# Altium footprint library Connectors.PcbLib: 245 footprints (part 4 of 16)
Each footprint in its own frame and in the unit in brackets; x right, y up, seen from the top. Pads: shape width x height; smd on the part's side, far side on the other; paste and mask are expansions set on the pad; w line width, h text height; cw(c..) or ccw(c..) is an arc to the next point about the centre after c.
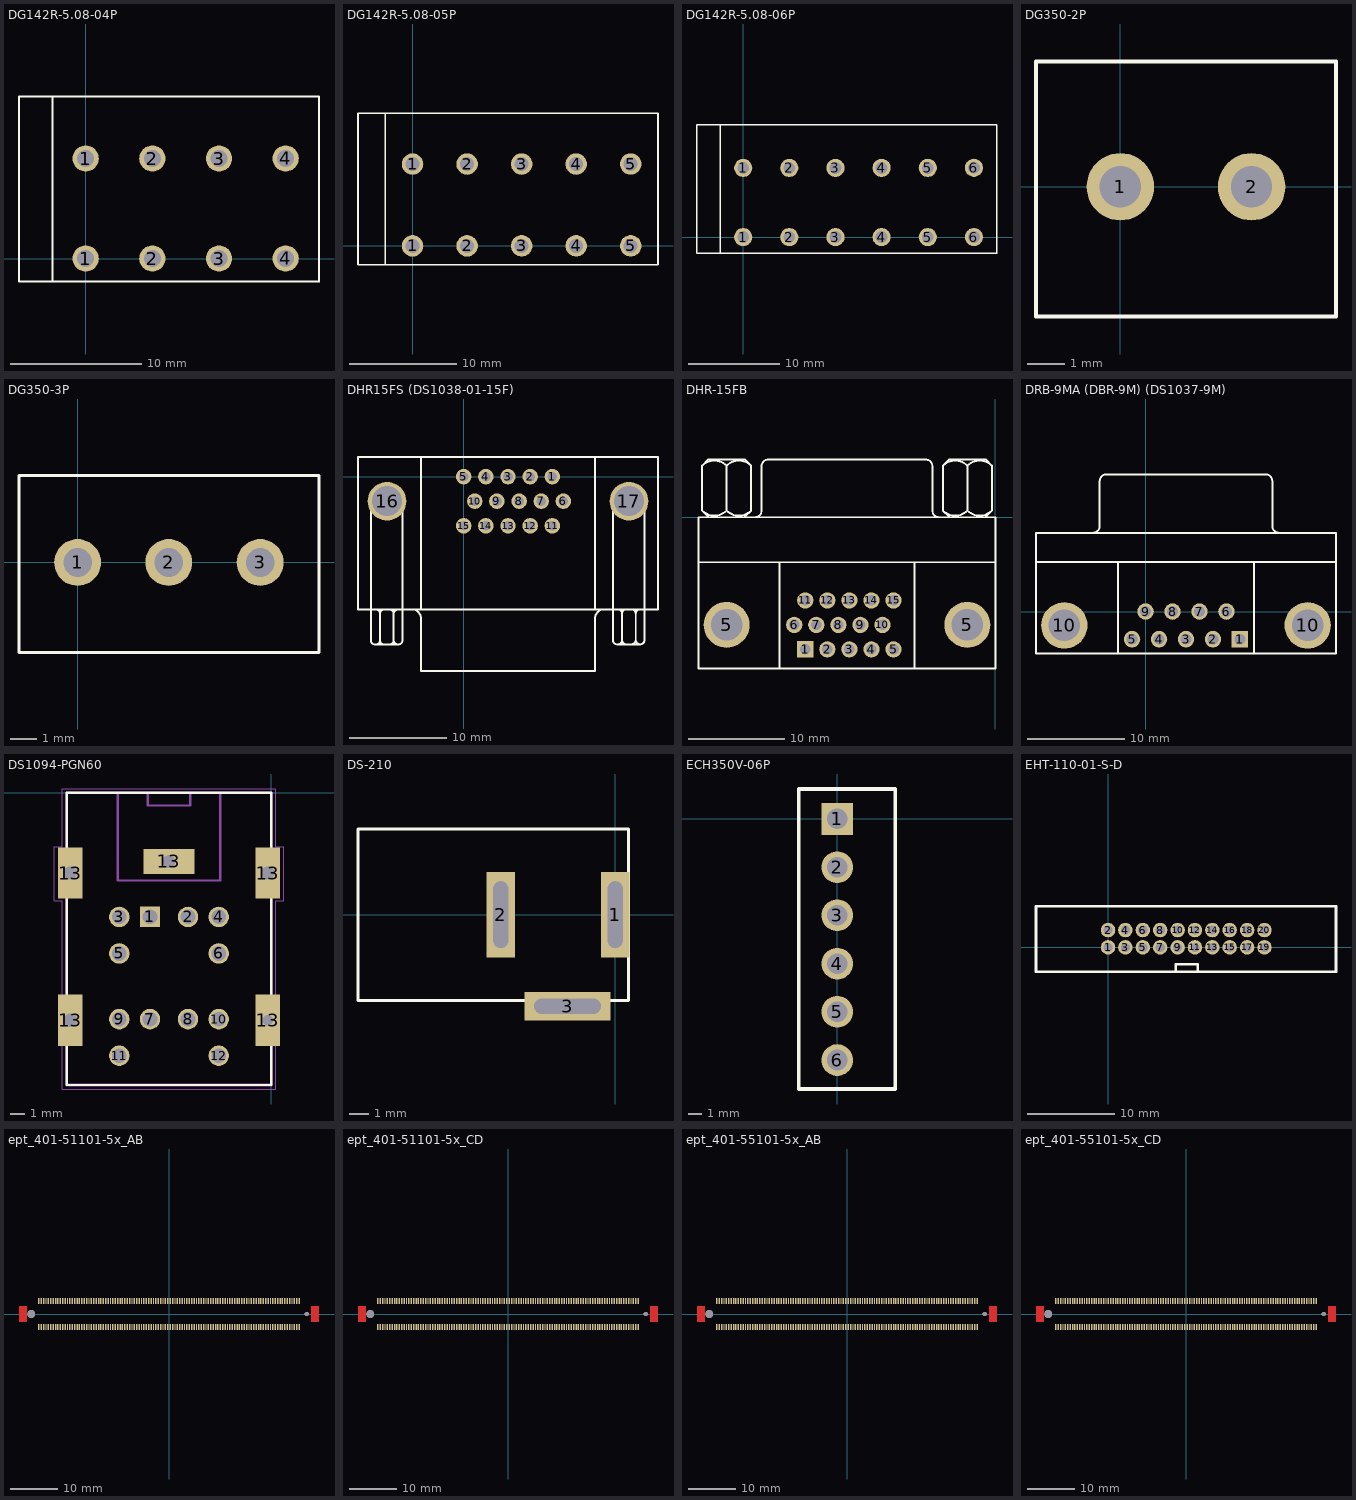
[diagram p3: the footprints below, top view; thin cyan lines are the x and y axes]

## DG142R-5.08-04P [mm]
pads (8):
  round 2 hole 1.3: 1(0,0) 1(0.001,7.618) 2(5.08,0) 2(5.08,7.62) 3(10.159,0.002) 3(10.159,7.622) 4(15.238,0.004) 4(15.238,7.624)
Top Overlay:
  lines w0.15: -2.541,-1.752 -5.081,-1.752 -5.081,-0.002 -5.081,12.348 -2.541,12.348 ; 17.772,12.348 0.001,12.348 -2.54,12.348 -2.54,0 -2.54,-1.752 0.001,-1.752 17.778,-1.752 17.779,-1.751 17.779,0.002 17.779,12.337
3D body "DG142R-4.stp": height 13.4, standoff -3.5, extent -5.129,-1.845 17.631,12.255

## DG142R-5.08-05P [mm]
pads (10):
  round 2 hole 1.3: 1(0,0) 1(0.001,7.618) 2(5.08,0) 2(5.08,7.62) 3(10.159,0.002) 3(10.159,7.622) 4(15.238,0.004) 4(15.238,7.624) 5(20.317,0.006) 5(20.317,7.626)
Top Overlay:
  lines w0.15: -2.541,-1.752 -5.081,-1.752 -5.081,-0.002 -5.081,12.348 -2.541,12.348 ; 22.818,12.348 0.001,12.348 -2.54,12.348 -2.54,0 -2.54,-1.752 0.001,-1.752 22.851,-1.752 ; 22.858,-1.749 22.858,0.004 22.858,12.339
3D body "DG142R-5.stp": height 13.4, standoff -3.5, extent -5.107,-1.732 22.733,12.368

## DG142R-5.08-06P [mm]
pads (12):
  round 2 hole 1.3: 1(0,0) 1(0.001,7.618) 2(5.08,0) 2(5.08,7.62) 3(10.159,0.002) 3(10.159,7.622) 4(15.238,0.004) 4(15.238,7.624) 5(20.317,0.006) 5(20.317,7.626) 6(25.396,0.008) 6(25.396,7.628)
Top Overlay:
  lines w0.15: -2.541,-1.752 -5.081,-1.752 -5.081,-0.002 -5.081,12.348 -2.541,12.348 ; 27.937,-1.752 0.001,-1.752 -2.54,-1.752 -2.54,0 -2.54,12.348 0.001,12.348 27.937,12.348 27.937,0.006 27.937,-1.744
3D body "DG142R-2-5.08.SLDPRT": height 13.4, standoff -3.5, extent -5.155,-1.698 27.865,12.402

## DG350-2P [mm] "колодка клеммная на плату"
pads (2):
  round 1.8 hole 1.1: 1(0,0) 2(3.5,0)
Top Overlay:
  lines w0.1: -2.25,-3.46 -2.25,3.34 5.75,3.34 5.75,-3.46 -2.25,-3.46
3D body "User Library-DG350-3,5-02P.STEP": height 8.4, standoff -3.4, extent -2.25,-3.46 5.75,3.34

## DG350-3P [mm] "колодка клеммная на плату"
pads (3):
  round 1.8 hole 1.1: 1(-0.01,0) 2(3.49,0) 3(7,0)
Top Overlay:
  lines w0.1: -2.26,-3.46 9.26,-3.46 9.26,3.34 -2.26,3.34 -2.26,-3.46
3D body "User Library-DG350-3,5-03P.STEP": height 8.4, standoff -3.5, extent -2.26,-3.4 9.24,3.4

## DHR15FS (DS1038-01-15F) [mm]
pads (17):
  round 1.6 hole 1: 1(9.16,0) 2(6.87,0) 3(4.58,0) 4(2.29,0) 5(0,0) 6(10.305,-2.54) 7(8.015,-2.54) 8(5.725,-2.54) 9(3.435,-2.54) 10(1.145,-2.54) 11(9.16,-5.08) 12(6.87,-5.08) 13(4.58,-5.08) 14(2.29,-5.08) 15(0,-5.08)
  round 4 hole 3.1: 16(-7.92,-2.54) 17(17.08,-2.54)
Top Overlay:
  lines w0.2: -9.57,-2.54 -9.57,-13.71 -9.59,-13.73 -9.59,-16.919 ccw(c-9.158,-16.919) -9.158,-17.35 -8.64,-17.35 -6.76,-17.35 ccw(c-6.76,-16.92) -6.33,-16.92 -6.33,-13.73 -6.32,-13.72 -6.32,-2.55 ; -9.16,-13.73 -8.641,-13.73 ; -9.081,-13.73 cw(c-9.081,-14.16) -8.651,-14.16 ; -9.08,-17.35 ccw(c-9.08,-16.92) -8.65,-16.92 ; -8.643,-14.161 cw(c-8.211,-14.161) -8.211,-13.73 ; -8.21,-17.35 cw(c-8.21,-16.919) -8.641,-16.919 -8.641,-13.73 ; -7.663,-13.739 cw(c-7.663,-14.17) -7.231,-14.17 cw(c-6.801,-14.17) -6.801,-13.74 ; -7.661,-17.341 ccw(c-7.661,-16.91) -7.23,-16.91 ; -7.23,-13.77 -7.23,-16.91 ; -6.8,-17.34 cw(c-6.8,-16.91) -7.23,-16.91 ; -6.761,-13.73 -8.641,-13.73 ; -5.422,-13.718 cw(c-5.363,-14.66) -4.42,-14.67 -4.42,-20.08 4.58,-20.08 13.58,-20.08 13.58,-14.67 cw(c14.523,-14.66) 14.582,-13.718 ; -4.42,-13.673 -4.42,2 ; 13.58,-13.71 13.58,2 ; 15.44,-2.52 15.44,-13.69 15.42,-13.71 15.42,-16.899 ccw(c15.852,-16.899) 15.852,-17.33 16.37,-17.33 18.25,-17.33 ccw(c18.25,-16.9) 18.68,-16.9 18.68,-13.71 18.69,-13.7 18.69,-2.53 ; 15.85,-13.71 16.369,-13.71 ; 15.929,-13.71 cw(c15.929,-14.14) 16.359,-14.14 ; 15.93,-17.33 ccw(c15.93,-16.9) 16.36,-16.9 ; 16.367,-14.141 cw(c16.799,-14.141) 16.799,-13.71 ; 16.8,-17.33 cw(c16.8,-16.899) 16.369,-16.899 16.369,-13.71 ; 17.347,-13.719 cw(c17.347,-14.15) 17.779,-14.15 cw(c18.209,-14.15) 18.209,-13.72 ; 17.349,-17.321 ccw(c17.349,-16.89) 17.78,-16.89 ; 17.78,-13.75 17.78,-16.89 ; 18.21,-17.32 cw(c18.21,-16.89) 17.78,-16.89 ; 18.249,-13.71 16.369,-13.71 ; -10.92,-13.71 4.58,-13.71 20.08,-13.71 20.08,2.02 4.58,2.02 -10.92,2.02 -10.92,-13.71

## DHR-15FB [mm]
height 12.75
pads (17):
  rect 1.69x1.69 hole 1.09: 1(-19.73,-13.71)
  round 1.69 hole 1.09: 2(-17.44,-13.71) 3(-15.15,-13.71) 4(-12.86,-13.71) 5(-10.57,-13.71) 6(-20.875,-11.17) 7(-18.585,-11.17) 8(-16.295,-11.17) 9(-14.005,-11.17) 10(-11.715,-11.17) 11(-19.73,-8.63) 12(-17.44,-8.63) 13(-15.15,-8.63) 14(-12.86,-8.63) 15(-10.57,-8.63)
  round 4.76 hole 3.26: 5(-27.895,-11.17) 5(-2.905,-11.17)
Top Overlay:
  lines w0.2: -30.8,-4.67 0,-4.67 ; -30.438,5.35 -30.438,0.699 -29.803,0.064 ; -30.438,5.365 -29.803,6 -25.993,6 -25.358,5.365 ; -27.898,0.699 -27.898,5.35 ; -25.993,0.064 -25.358,0.699 -25.358,5.35 ; -25.358,4.086 -25.358,4.298 ; -24.96,0.005 ccw(c-24.96,0.7) -24.265,0.7 -24.265,5.3 ; -24.26,5.305 cw(c-23.565,5.305) -23.565,6 -7.235,6 cw(c-7.235,5.305) -6.54,5.305 ; -22.4,-15.7 -22.4,-4.67 ; -8.4,-15.7 -8.4,-4.67 ; -6.535,5.3 -6.535,0.7 ccw(c-5.84,0.7) -5.84,0.005 ; -5.438,5.35 -5.438,0.699 -4.803,0.064 ; -5.438,5.365 -4.803,6 -0.993,6 -0.358,5.365 ; -2.898,0.699 -2.898,5.35 ; -0.993,0.064 -0.358,0.699 -0.358,5.35 ; -0.358,4.086 -0.358,4.298 ; -30.8,-15.7 -30.8,0 0,0 0,-15.7 -30.8,-15.7
  lines w0.203: -30.44,0.697 ccw(c-29.168,1.969) -27.896,0.697 ; -30.438,5.35 cw(c-29.166,4.078) -27.893,5.35 ; -27.902,5.35 cw(c-26.63,4.078) -25.358,5.35 ; -27.9,0.697 ccw(c-26.628,1.969) -25.356,0.697 ; -5.44,0.697 ccw(c-4.168,1.969) -2.896,0.697 ; -5.438,5.35 cw(c-4.166,4.078) -2.893,5.35 ; -2.902,5.35 cw(c-1.63,4.078) -0.358,5.35 ; -2.9,0.697 ccw(c-1.628,1.969) -0.356,0.697
3D body "618015325223.stp": height 12.55, standoff -3.96, extent -30.8,-15.92 0,6.38

## DRB-9MA (DBR-9M) (DS1037-9M) [mm] "Connector; D Subminiature; 9 Position; Right Angle; Pitch 1.385 mm"
height 12.75
pads (11):
  rect 1.69x1.69 hole 1.09: 1(9.695,-2.84)
  round 1.69 hole 1.09: 2(6.925,-2.84) 3(4.155,-2.84) 4(1.385,-2.84) 5(-1.385,-2.84) 6(8.31,0) 7(5.54,0) 8(2.77,0) 9(0,0)
  round 4.76 hole 3.26: 10(-8.34,-1.42) 10(16.65,-1.42)
Top Overlay:
  lines w0.2: -11.245,5.08 19.555,5.08 ; -5.405,8.085 ccw(c-5.405,8.78) -4.71,8.78 -4.71,13.38 ; -4.705,13.385 cw(c-4.01,13.385) -4.01,14.08 12.32,14.08 cw(c12.32,13.385) 13.015,13.385 ; -2.845,-4.32 -2.845,5.08 ; 11.155,-4.32 11.155,5.08 ; 13.02,13.38 13.02,8.78 ccw(c13.715,8.78) 13.715,8.085 ; -11.245,-4.32 19.555,-4.32 19.555,8.08 -11.245,8.08 -11.245,-4.32
Bottom Overlay:
  text "6" at 8.83,1.18 h3
  text "9" at 0.4,1.28 h3
  text "1" at 10.17,-5.94 h3
  text "5" at -0.97,-5.89 h3
3D body "User Library-43767.STEP": height 12.52, standoff -3.98, extent -11.26,-4.415 19.54,14.085

## DS1094-PGN60 [mm]
pads (17):
  rect 1.4x1.4 hole 1: 1(-8.3,-8.5)
  round 1.4 hole 1: 2(-5.7,-8.5) 3(-10.4,-8.5) 4(-3.6,-8.5) 5(-10.4,-11) 6(-3.6,-11) 7(-8.3,-15.49) 8(-5.7,-15.49) 9(-10.4,-15.49) 10(-3.6,-15.49) 11(-10.4,-17.99) 12(-3.6,-17.99)
  rect 1.7x3.5 hole 0.9 square: 13(-13.75,-15.57) 13(-13.75,-5.5) 13(-0.25,-5.5)
  rect 3.5x1.7 hole 0.9 square: 13(-7,-4.7)
  rect 1.7x3.5 hole 0.7 square: 13(-0.25,-15.57)
Top Overlay:
  lines w0.15: -14,-20 -14,0 ; -0.01,-19.37 0,-19.36 ; 0,-20 0,0
  lines w0.152: -14,-20 0,-20 ; -14,-13 -14,-7.4 ; -14,-3.7 -14,0 0,0 0,-3.7 ; 0,-13 0,-7.4
Mechanical 1:
  lines w0: -14.1,-6.6 -13.4,-6.6 -13.4,-4.4 -14.1,-4.4 -14.1,-6.6 ; -8.1,-5.05 -5.9,-5.05 -5.9,-4.35 -8.1,-4.35 -8.1,-5.05 ; -0.6,-6.6 0.1,-6.6 0.1,-4.4 -0.6,-4.4 -0.6,-6.6
Mechanical 4:
  lines w0.152: -14,0 -10.5,0 ; -14,0 -14,-19.97 0,-19.97 0,0 ; -14,0 -10.5,0 ; -14,0 -14,-20.03 0,-20.03 0,0 ; -10.5,-6 -10.5,0 ; -10.5,-6 -3.5,-6 ; -10.5,-6 -10.5,0 ; -10.5,-6 -3.5,-6 ; -10.5,0 -3.5,0 ; -10.5,0 -3.5,0 ; -8.448,-0.888 -8.448,-0.08 -8.448,-0.888 ; -8.448,-0.888 -5.552,-0.888 ; -8.448,-0.888 -5.552,-0.888 ; -5.552,-0.888 -5.552,-0.08 -5.552,-0.888 ; -3.5,-6 -3.5,0 ; -3.5,-6 -3.5,0 ; -3.5,0 0,0 ; -3.5,0 0,0
Mechanical 16:
  lines w0.05: -14.85,-7.4 -14.3,-7.4 -14.3,-20.27 0.3,-20.27 0.3,-7.4 0.85,-7.4 0.85,-3.7 0.3,-3.7 0.3,0.25 -14.3,0.25 -14.3,-3.7 -14.85,-3.7 -14.85,-7.4
3D body "1734021-4.stp": height 28.5, standoff -3.65, extent -14.22,-19.96 0.23,0.04

## DS-210 [mm]
pads (3):
  rect 1.5x4.5 hole 0.8 slot 3.5 at 90 deg: 1(0,0) 2(-6,0)
  rect 4.5x1.5 hole 0.8 slot 3.5 at 0 deg: 3(-2.5,-4.8)
Top Overlay:
  lines w0.15: -13.5,-4.5 0.7,-4.5 0.7,4.5 -13.5,4.5 -13.5,-4.5
3D body "User Library-ds-210.step": height 11.3, standoff -4.1, extent -13.8,-5.02 0.7,4.53

## ECH350V-06P [mm]
pads (6):
  rect 2.3x2.3 hole 1.5: 1(0,0)
  round 2.3 hole 1.5: 2(0,-3.5) 3(0,-7) 4(0,-10.5) 5(0,-14) 6(0,-17.5)
Top Overlay:
  lines w0.254: -2.8,-19.6 4.2,-19.6 4.2,2.17 -2.8,2.17 -2.8,-19.6
3D body "User Library-ECH381V-06P.step": height 9.2, standoff -3.4, extent -2.78,-20.905 4.42,2.745

## EHT-110-01-S-D [mm]
pads (20):
  round 1.67 hole 1.07: 1(0,0) 2(0,2) 3(2,0) 4(2,2) 5(4,0) 6(4,2) 7(6,0) 8(6,2) 9(8,0) 10(8,2) 11(10,0) 12(10,2) 13(12,0) 14(12,2) 15(14,0) 16(14,2) 17(16,0) 18(16,2) 19(18,0) 20(18,2)
Top Overlay:
  lines w0.3: 7.79,-2.76 7.79,-1.92 10.29,-1.92 ; 10.33,-2.8 10.33,-1.92 ; -8.29,-2.82 26.23,-2.82 26.23,4.76 -8.29,4.76 -8.29,-2.82
3D body "EHT-110-01-S-D.stp": height 12.19, standoff -2.9, extent -8.155,-2.87 26.23,4.75

## ept_401-51101-5x_AB [mm]
pads (220):
  rect 0.3x1.2 smd: A1(27.25,2.7) A2(26.75,2.7) A3(26.25,2.7) A4(25.75,2.7) A5(25.25,2.7) A6(24.75,2.7) A7(24.25,2.7) A8(23.75,2.7) A9(23.25,2.7) A10(22.75,2.7) A11(22.25,2.7) A12(21.75,2.7) A13(21.25,2.7) A14(20.75,2.7) A15(20.25,2.7) A16(19.75,2.7) A17(19.25,2.7) A18(18.75,2.7) A19(18.25,2.7) A20(17.75,2.7) A21(17.25,2.7) A22(16.75,2.7) A23(16.25,2.7) A24(15.75,2.7) A25(15.25,2.7) A26(14.75,2.7) A27(14.25,2.7) A28(13.75,2.7) A29(13.25,2.7) A30(12.75,2.7) A31(12.25,2.7) A32(11.75,2.7) A33(11.25,2.7) A34(10.75,2.7) A35(10.25,2.7) A36(9.75,2.7) A37(9.25,2.7) A38(8.75,2.7) A39(8.25,2.7) A40(7.75,2.7) A41(7.25,2.7) A42(6.75,2.7) A43(6.25,2.7) A44(5.75,2.7) A45(5.25,2.7) A46(4.75,2.7) A47(4.25,2.7) A48(3.75,2.7) A49(3.25,2.7) A50(2.75,2.7) A51(2.25,2.7) A52(1.75,2.7) A53(1.25,2.7) A54(0.75,2.7) A55(0.25,2.7) A56(-0.25,2.7) A57(-0.75,2.7) A58(-1.25,2.7) A59(-1.75,2.7) A60(-2.25,2.7) A61(-2.75,2.7) A62(-3.25,2.7) A63(-3.75,2.7) A64(-4.25,2.7) A65(-4.75,2.7) A66(-5.25,2.7) A67(-5.75,2.7) A68(-6.25,2.7) A69(-6.75,2.7) A70(-7.25,2.7) A71(-7.75,2.7) A72(-8.25,2.7) A73(-8.75,2.7) A74(-9.25,2.7) A75(-9.75,2.7) A76(-10.25,2.7) A77(-10.75,2.7) A78(-11.25,2.7) A79(-11.75,2.7) A80(-12.25,2.7) A81(-12.75,2.7) A82(-13.25,2.7) A83(-13.75,2.7) A84(-14.25,2.7) A85(-14.75,2.7) A86(-15.25,2.7) A87(-15.75,2.7) A88(-16.25,2.7) A89(-16.75,2.7) A90(-17.25,2.7) A91(-17.75,2.7) A92(-18.25,2.7) A93(-18.75,2.7) A94(-19.25,2.7) A95(-19.75,2.7) A96(-20.25,2.7) A97(-20.75,2.7) A98(-21.25,2.7) A99(-21.75,2.7) A100(-22.25,2.7) A101(-22.75,2.7) A102(-23.25,2.7) A103(-23.75,2.7) A104(-24.25,2.7) A105(-24.75,2.7) A106(-25.25,2.7) A107(-25.75,2.7) A108(-26.25,2.7) A109(-26.75,2.7) A110(-27.25,2.7) B1(27.25,-2.7) B2(26.75,-2.7) B3(26.25,-2.7) B4(25.75,-2.7) B5(25.25,-2.7) B6(24.75,-2.7) B7(24.25,-2.7) B8(23.75,-2.7) B9(23.25,-2.7) B10(22.75,-2.7) B11(22.25,-2.7) B12(21.75,-2.7) B13(21.25,-2.7) B14(20.75,-2.7) B15(20.25,-2.7) B16(19.75,-2.7) B17(19.25,-2.7) B18(18.75,-2.7) B19(18.25,-2.7) B20(17.75,-2.7) B21(17.25,-2.7) B22(16.75,-2.7) B23(16.25,-2.7) B24(15.75,-2.7) B25(15.25,-2.7) B26(14.75,-2.7) B27(14.25,-2.7) B28(13.75,-2.7) B29(13.25,-2.7) B30(12.75,-2.7) B31(12.25,-2.7) B32(11.75,-2.7) B33(11.25,-2.7) B34(10.75,-2.7) B35(10.25,-2.7) B36(9.75,-2.7) B37(9.25,-2.7) B38(8.75,-2.7) B39(8.25,-2.7) B40(7.75,-2.7) B41(7.25,-2.7) B42(6.75,-2.7) B43(6.25,-2.7) B44(5.75,-2.7) B45(5.25,-2.7) B46(4.75,-2.7) B47(4.25,-2.7) B48(3.75,-2.7) B49(3.25,-2.7) B50(2.75,-2.7) B51(2.25,-2.7) B52(1.75,-2.7) B53(1.25,-2.7) B54(0.75,-2.7) B55(0.25,-2.7) B56(-0.25,-2.7) B57(-0.75,-2.7) B58(-1.25,-2.7) B59(-1.75,-2.7) B60(-2.25,-2.7) B61(-2.75,-2.7) B62(-3.25,-2.7) B63(-3.75,-2.7) B64(-4.25,-2.7) B65(-4.75,-2.7) B66(-5.25,-2.7) B67(-5.75,-2.7) B68(-6.25,-2.7) B69(-6.75,-2.7) B70(-7.25,-2.7) B71(-7.75,-2.7) B72(-8.25,-2.7) B73(-8.75,-2.7) B74(-9.25,-2.7) B75(-9.75,-2.7) B76(-10.25,-2.7) B77(-10.75,-2.7) B78(-11.25,-2.7) B79(-11.75,-2.7) B80(-12.25,-2.7) B81(-12.75,-2.7) B82(-13.25,-2.7) B83(-13.75,-2.7) B84(-14.25,-2.7) B85(-14.75,-2.7) B86(-15.25,-2.7) B87(-15.75,-2.7) B88(-16.25,-2.7) B89(-16.75,-2.7) B90(-17.25,-2.7) B91(-17.75,-2.7) B92(-18.25,-2.7) B93(-18.75,-2.7) B94(-19.25,-2.7) B95(-19.75,-2.7) B96(-20.25,-2.7) B97(-20.75,-2.7) B98(-21.25,-2.7) B99(-21.75,-2.7) B100(-22.25,-2.7) B101(-22.75,-2.7) B102(-23.25,-2.7) B103(-23.75,-2.7) B104(-24.25,-2.7) B105(-24.75,-2.7) B106(-25.25,-2.7) B107(-25.75,-2.7) B108(-26.25,-2.7) B109(-26.75,-2.7) B110(-27.25,-2.7)
via 28.85,0 diameter 0.9 hole 0.9
via -28.85,0 diameter 1.6 hole 1.6
Top Layer:
  rectangle: -31.4,-1.65 -29.75,1.65
  rectangle: 29.75,-1.65 31.4,1.65
3D body "ept_401-51101-5x_3D.STEP": height 4.45, standoff -0.6, extent -30.9,-3.1 30.9,3.1

## ept_401-51101-5x_CD [mm]
pads (220):
  rect 0.3x1.2 smd: C1(27.25,2.7) C2(26.75,2.7) C3(26.25,2.7) C4(25.75,2.7) C5(25.25,2.7) C6(24.75,2.7) C7(24.25,2.7) C8(23.75,2.7) C9(23.25,2.7) C10(22.75,2.7) C11(22.25,2.7) C12(21.75,2.7) C13(21.25,2.7) C14(20.75,2.7) C15(20.25,2.7) C16(19.75,2.7) C17(19.25,2.7) C18(18.75,2.7) C19(18.25,2.7) C20(17.75,2.7) C21(17.25,2.7) C22(16.75,2.7) C23(16.25,2.7) C24(15.75,2.7) C25(15.25,2.7) C26(14.75,2.7) C27(14.25,2.7) C28(13.75,2.7) C29(13.25,2.7) C30(12.75,2.7) C31(12.25,2.7) C32(11.75,2.7) C33(11.25,2.7) C34(10.75,2.7) C35(10.25,2.7) C36(9.75,2.7) C37(9.25,2.7) C38(8.75,2.7) C39(8.25,2.7) C40(7.75,2.7) C41(7.25,2.7) C42(6.75,2.7) C43(6.25,2.7) C44(5.75,2.7) C45(5.25,2.7) C46(4.75,2.7) C47(4.25,2.7) C48(3.75,2.7) C49(3.25,2.7) C50(2.75,2.7) C51(2.25,2.7) C52(1.75,2.7) C53(1.25,2.7) C54(0.75,2.7) C55(0.25,2.7) C56(-0.25,2.7) C57(-0.75,2.7) C58(-1.25,2.7) C59(-1.75,2.7) C60(-2.25,2.7) C61(-2.75,2.7) C62(-3.25,2.7) C63(-3.75,2.7) C64(-4.25,2.7) C65(-4.75,2.7) C66(-5.25,2.7) C67(-5.75,2.7) C68(-6.25,2.7) C69(-6.75,2.7) C70(-7.25,2.7) C71(-7.75,2.7) C72(-8.25,2.7) C73(-8.75,2.7) C74(-9.25,2.7) C75(-9.75,2.7) C76(-10.25,2.7) C77(-10.75,2.7) C78(-11.25,2.7) C79(-11.75,2.7) C80(-12.25,2.7) C81(-12.75,2.7) C82(-13.25,2.7) C83(-13.75,2.7) C84(-14.25,2.7) C85(-14.75,2.7) C86(-15.25,2.7) C87(-15.75,2.7) C88(-16.25,2.7) C89(-16.75,2.7) C90(-17.25,2.7) C91(-17.75,2.7) C92(-18.25,2.7) C93(-18.75,2.7) C94(-19.25,2.7) C95(-19.75,2.7) C96(-20.25,2.7) C97(-20.75,2.7) C98(-21.25,2.7) C99(-21.75,2.7) C100(-22.25,2.7) C101(-22.75,2.7) C102(-23.25,2.7) C103(-23.75,2.7) C104(-24.25,2.7) C105(-24.75,2.7) C106(-25.25,2.7) C107(-25.75,2.7) C108(-26.25,2.7) C109(-26.75,2.7) C110(-27.25,2.7) D1(27.25,-2.7) D2(26.75,-2.7) D3(26.25,-2.7) D4(25.75,-2.7) D5(25.25,-2.7) D6(24.75,-2.7) D7(24.25,-2.7) D8(23.75,-2.7) D9(23.25,-2.7) D10(22.75,-2.7) D11(22.25,-2.7) D12(21.75,-2.7) D13(21.25,-2.7) D14(20.75,-2.7) D15(20.25,-2.7) D16(19.75,-2.7) D17(19.25,-2.7) D18(18.75,-2.7) D19(18.25,-2.7) D20(17.75,-2.7) D21(17.25,-2.7) D22(16.75,-2.7) D23(16.25,-2.7) D24(15.75,-2.7) D25(15.25,-2.7) D26(14.75,-2.7) D27(14.25,-2.7) D28(13.75,-2.7) D29(13.25,-2.7) D30(12.75,-2.7) D31(12.25,-2.7) D32(11.75,-2.7) D33(11.25,-2.7) D34(10.75,-2.7) D35(10.25,-2.7) D36(9.75,-2.7) D37(9.25,-2.7) D38(8.75,-2.7) D39(8.25,-2.7) D40(7.75,-2.7) D41(7.25,-2.7) D42(6.75,-2.7) D43(6.25,-2.7) D44(5.75,-2.7) D45(5.25,-2.7) D46(4.75,-2.7) D47(4.25,-2.7) D48(3.75,-2.7) D49(3.25,-2.7) D50(2.75,-2.7) D51(2.25,-2.7) D52(1.75,-2.7) D53(1.25,-2.7) D54(0.75,-2.7) D55(0.25,-2.7) D56(-0.25,-2.7) D57(-0.75,-2.7) D58(-1.25,-2.7) D59(-1.75,-2.7) D60(-2.25,-2.7) D61(-2.75,-2.7) D62(-3.25,-2.7) D63(-3.75,-2.7) D64(-4.25,-2.7) D65(-4.75,-2.7) D66(-5.25,-2.7) D67(-5.75,-2.7) D68(-6.25,-2.7) D69(-6.75,-2.7) D70(-7.25,-2.7) D71(-7.75,-2.7) D72(-8.25,-2.7) D73(-8.75,-2.7) D74(-9.25,-2.7) D75(-9.75,-2.7) D76(-10.25,-2.7) D77(-10.75,-2.7) D78(-11.25,-2.7) D79(-11.75,-2.7) D80(-12.25,-2.7) D81(-12.75,-2.7) D82(-13.25,-2.7) D83(-13.75,-2.7) D84(-14.25,-2.7) D85(-14.75,-2.7) D86(-15.25,-2.7) D87(-15.75,-2.7) D88(-16.25,-2.7) D89(-16.75,-2.7) D90(-17.25,-2.7) D91(-17.75,-2.7) D92(-18.25,-2.7) D93(-18.75,-2.7) D94(-19.25,-2.7) D95(-19.75,-2.7) D96(-20.25,-2.7) D97(-20.75,-2.7) D98(-21.25,-2.7) D99(-21.75,-2.7) D100(-22.25,-2.7) D101(-22.75,-2.7) D102(-23.25,-2.7) D103(-23.75,-2.7) D104(-24.25,-2.7) D105(-24.75,-2.7) D106(-25.25,-2.7) D107(-25.75,-2.7) D108(-26.25,-2.7) D109(-26.75,-2.7) D110(-27.25,-2.7)
via 28.85,0 diameter 0.9 hole 0.9
via -28.85,0 diameter 1.6 hole 1.6
Top Layer:
  rectangle: -31.4,-1.65 -29.75,1.65
  rectangle: 29.75,-1.65 31.4,1.65
3D body "ept_401-51101-5x_3D.STEP": height 4.45, standoff -0.6, extent -30.9,-3.1 30.9,3.1

## ept_401-55101-5x_AB [mm]
pads (220):
  rect 0.3x1.2 smd: A1(27.25,2.7) A2(26.75,2.7) A3(26.25,2.7) A4(25.75,2.7) A5(25.25,2.7) A6(24.75,2.7) A7(24.25,2.7) A8(23.75,2.7) A9(23.25,2.7) A10(22.75,2.7) A11(22.25,2.7) A12(21.75,2.7) A13(21.25,2.7) A14(20.75,2.7) A15(20.25,2.7) A16(19.75,2.7) A17(19.25,2.7) A18(18.75,2.7) A19(18.25,2.7) A20(17.75,2.7) A21(17.25,2.7) A22(16.75,2.7) A23(16.25,2.7) A24(15.75,2.7) A25(15.25,2.7) A26(14.75,2.7) A27(14.25,2.7) A28(13.75,2.7) A29(13.25,2.7) A30(12.75,2.7) A31(12.25,2.7) A32(11.75,2.7) A33(11.25,2.7) A34(10.75,2.7) A35(10.25,2.7) A36(9.75,2.7) A37(9.25,2.7) A38(8.75,2.7) A39(8.25,2.7) A40(7.75,2.7) A41(7.25,2.7) A42(6.75,2.7) A43(6.25,2.7) A44(5.75,2.7) A45(5.25,2.7) A46(4.75,2.7) A47(4.25,2.7) A48(3.75,2.7) A49(3.25,2.7) A50(2.75,2.7) A51(2.25,2.7) A52(1.75,2.7) A53(1.25,2.7) A54(0.75,2.7) A55(0.25,2.7) A56(-0.25,2.7) A57(-0.75,2.7) A58(-1.25,2.7) A59(-1.75,2.7) A60(-2.25,2.7) A61(-2.75,2.7) A62(-3.25,2.7) A63(-3.75,2.7) A64(-4.25,2.7) A65(-4.75,2.7) A66(-5.25,2.7) A67(-5.75,2.7) A68(-6.25,2.7) A69(-6.75,2.7) A70(-7.25,2.7) A71(-7.75,2.7) A72(-8.25,2.7) A73(-8.75,2.7) A74(-9.25,2.7) A75(-9.75,2.7) A76(-10.25,2.7) A77(-10.75,2.7) A78(-11.25,2.7) A79(-11.75,2.7) A80(-12.25,2.7) A81(-12.75,2.7) A82(-13.25,2.7) A83(-13.75,2.7) A84(-14.25,2.7) A85(-14.75,2.7) A86(-15.25,2.7) A87(-15.75,2.7) A88(-16.25,2.7) A89(-16.75,2.7) A90(-17.25,2.7) A91(-17.75,2.7) A92(-18.25,2.7) A93(-18.75,2.7) A94(-19.25,2.7) A95(-19.75,2.7) A96(-20.25,2.7) A97(-20.75,2.7) A98(-21.25,2.7) A99(-21.75,2.7) A100(-22.25,2.7) A101(-22.75,2.7) A102(-23.25,2.7) A103(-23.75,2.7) A104(-24.25,2.7) A105(-24.75,2.7) A106(-25.25,2.7) A107(-25.75,2.7) A108(-26.25,2.7) A109(-26.75,2.7) A110(-27.25,2.7) B1(27.25,-2.7) B2(26.75,-2.7) B3(26.25,-2.7) B4(25.75,-2.7) B5(25.25,-2.7) B6(24.75,-2.7) B7(24.25,-2.7) B8(23.75,-2.7) B9(23.25,-2.7) B10(22.75,-2.7) B11(22.25,-2.7) B12(21.75,-2.7) B13(21.25,-2.7) B14(20.75,-2.7) B15(20.25,-2.7) B16(19.75,-2.7) B17(19.25,-2.7) B18(18.75,-2.7) B19(18.25,-2.7) B20(17.75,-2.7) B21(17.25,-2.7) B22(16.75,-2.7) B23(16.25,-2.7) B24(15.75,-2.7) B25(15.25,-2.7) B26(14.75,-2.7) B27(14.25,-2.7) B28(13.75,-2.7) B29(13.25,-2.7) B30(12.75,-2.7) B31(12.25,-2.7) B32(11.75,-2.7) B33(11.25,-2.7) B34(10.75,-2.7) B35(10.25,-2.7) B36(9.75,-2.7) B37(9.25,-2.7) B38(8.75,-2.7) B39(8.25,-2.7) B40(7.75,-2.7) B41(7.25,-2.7) B42(6.75,-2.7) B43(6.25,-2.7) B44(5.75,-2.7) B45(5.25,-2.7) B46(4.75,-2.7) B47(4.25,-2.7) B48(3.75,-2.7) B49(3.25,-2.7) B50(2.75,-2.7) B51(2.25,-2.7) B52(1.75,-2.7) B53(1.25,-2.7) B54(0.75,-2.7) B55(0.25,-2.7) B56(-0.25,-2.7) B57(-0.75,-2.7) B58(-1.25,-2.7) B59(-1.75,-2.7) B60(-2.25,-2.7) B61(-2.75,-2.7) B62(-3.25,-2.7) B63(-3.75,-2.7) B64(-4.25,-2.7) B65(-4.75,-2.7) B66(-5.25,-2.7) B67(-5.75,-2.7) B68(-6.25,-2.7) B69(-6.75,-2.7) B70(-7.25,-2.7) B71(-7.75,-2.7) B72(-8.25,-2.7) B73(-8.75,-2.7) B74(-9.25,-2.7) B75(-9.75,-2.7) B76(-10.25,-2.7) B77(-10.75,-2.7) B78(-11.25,-2.7) B79(-11.75,-2.7) B80(-12.25,-2.7) B81(-12.75,-2.7) B82(-13.25,-2.7) B83(-13.75,-2.7) B84(-14.25,-2.7) B85(-14.75,-2.7) B86(-15.25,-2.7) B87(-15.75,-2.7) B88(-16.25,-2.7) B89(-16.75,-2.7) B90(-17.25,-2.7) B91(-17.75,-2.7) B92(-18.25,-2.7) B93(-18.75,-2.7) B94(-19.25,-2.7) B95(-19.75,-2.7) B96(-20.25,-2.7) B97(-20.75,-2.7) B98(-21.25,-2.7) B99(-21.75,-2.7) B100(-22.25,-2.7) B101(-22.75,-2.7) B102(-23.25,-2.7) B103(-23.75,-2.7) B104(-24.25,-2.7) B105(-24.75,-2.7) B106(-25.25,-2.7) B107(-25.75,-2.7) B108(-26.25,-2.7) B109(-26.75,-2.7) B110(-27.25,-2.7)
via 28.85,0 diameter 0.9 hole 0.9
via -28.85,0 diameter 1.6 hole 1.6
Top Layer:
  rectangle: -31.4,-1.65 -29.75,1.65
  rectangle: 29.75,-1.65 31.4,1.65
3D body "ept_401-55101-5x_3D.STEP": height 7.45, standoff -0.6, extent -30.9,-3.1 30.9,3.1

## ept_401-55101-5x_CD [mm]
pads (220):
  rect 0.3x1.2 smd: C1(27.25,2.7) C2(26.75,2.7) C3(26.25,2.7) C4(25.75,2.7) C5(25.25,2.7) C6(24.75,2.7) C7(24.25,2.7) C8(23.75,2.7) C9(23.25,2.7) C10(22.75,2.7) C11(22.25,2.7) C12(21.75,2.7) C13(21.25,2.7) C14(20.75,2.7) C15(20.25,2.7) C16(19.75,2.7) C17(19.25,2.7) C18(18.75,2.7) C19(18.25,2.7) C20(17.75,2.7) C21(17.25,2.7) C22(16.75,2.7) C23(16.25,2.7) C24(15.75,2.7) C25(15.25,2.7) C26(14.75,2.7) C27(14.25,2.7) C28(13.75,2.7) C29(13.25,2.7) C30(12.75,2.7) C31(12.25,2.7) C32(11.75,2.7) C33(11.25,2.7) C34(10.75,2.7) C35(10.25,2.7) C36(9.75,2.7) C37(9.25,2.7) C38(8.75,2.7) C39(8.25,2.7) C40(7.75,2.7) C41(7.25,2.7) C42(6.75,2.7) C43(6.25,2.7) C44(5.75,2.7) C45(5.25,2.7) C46(4.75,2.7) C47(4.25,2.7) C48(3.75,2.7) C49(3.25,2.7) C50(2.75,2.7) C51(2.25,2.7) C52(1.75,2.7) C53(1.25,2.7) C54(0.75,2.7) C55(0.25,2.7) C56(-0.25,2.7) C57(-0.75,2.7) C58(-1.25,2.7) C59(-1.75,2.7) C60(-2.25,2.7) C61(-2.75,2.7) C62(-3.25,2.7) C63(-3.75,2.7) C64(-4.25,2.7) C65(-4.75,2.7) C66(-5.25,2.7) C67(-5.75,2.7) C68(-6.25,2.7) C69(-6.75,2.7) C70(-7.25,2.7) C71(-7.75,2.7) C72(-8.25,2.7) C73(-8.75,2.7) C74(-9.25,2.7) C75(-9.75,2.7) C76(-10.25,2.7) C77(-10.75,2.7) C78(-11.25,2.7) C79(-11.75,2.7) C80(-12.25,2.7) C81(-12.75,2.7) C82(-13.25,2.7) C83(-13.75,2.7) C84(-14.25,2.7) C85(-14.75,2.7) C86(-15.25,2.7) C87(-15.75,2.7) C88(-16.25,2.7) C89(-16.75,2.7) C90(-17.25,2.7) C91(-17.75,2.7) C92(-18.25,2.7) C93(-18.75,2.7) C94(-19.25,2.7) C95(-19.75,2.7) C96(-20.25,2.7) C97(-20.75,2.7) C98(-21.25,2.7) C99(-21.75,2.7) C100(-22.25,2.7) C101(-22.75,2.7) C102(-23.25,2.7) C103(-23.75,2.7) C104(-24.25,2.7) C105(-24.75,2.7) C106(-25.25,2.7) C107(-25.75,2.7) C108(-26.25,2.7) C109(-26.75,2.7) C110(-27.25,2.7) D1(27.25,-2.7) D2(26.75,-2.7) D3(26.25,-2.7) D4(25.75,-2.7) D5(25.25,-2.7) D6(24.75,-2.7) D7(24.25,-2.7) D8(23.75,-2.7) D9(23.25,-2.7) D10(22.75,-2.7) D11(22.25,-2.7) D12(21.75,-2.7) D13(21.25,-2.7) D14(20.75,-2.7) D15(20.25,-2.7) D16(19.75,-2.7) D17(19.25,-2.7) D18(18.75,-2.7) D19(18.25,-2.7) D20(17.75,-2.7) D21(17.25,-2.7) D22(16.75,-2.7) D23(16.25,-2.7) D24(15.75,-2.7) D25(15.25,-2.7) D26(14.75,-2.7) D27(14.25,-2.7) D28(13.75,-2.7) D29(13.25,-2.7) D30(12.75,-2.7) D31(12.25,-2.7) D32(11.75,-2.7) D33(11.25,-2.7) D34(10.75,-2.7) D35(10.25,-2.7) D36(9.75,-2.7) D37(9.25,-2.7) D38(8.75,-2.7) D39(8.25,-2.7) D40(7.75,-2.7) D41(7.25,-2.7) D42(6.75,-2.7) D43(6.25,-2.7) D44(5.75,-2.7) D45(5.25,-2.7) D46(4.75,-2.7) D47(4.25,-2.7) D48(3.75,-2.7) D49(3.25,-2.7) D50(2.75,-2.7) D51(2.25,-2.7) D52(1.75,-2.7) D53(1.25,-2.7) D54(0.75,-2.7) D55(0.25,-2.7) D56(-0.25,-2.7) D57(-0.75,-2.7) D58(-1.25,-2.7) D59(-1.75,-2.7) D60(-2.25,-2.7) D61(-2.75,-2.7) D62(-3.25,-2.7) D63(-3.75,-2.7) D64(-4.25,-2.7) D65(-4.75,-2.7) D66(-5.25,-2.7) D67(-5.75,-2.7) D68(-6.25,-2.7) D69(-6.75,-2.7) D70(-7.25,-2.7) D71(-7.75,-2.7) D72(-8.25,-2.7) D73(-8.75,-2.7) D74(-9.25,-2.7) D75(-9.75,-2.7) D76(-10.25,-2.7) D77(-10.75,-2.7) D78(-11.25,-2.7) D79(-11.75,-2.7) D80(-12.25,-2.7) D81(-12.75,-2.7) D82(-13.25,-2.7) D83(-13.75,-2.7) D84(-14.25,-2.7) D85(-14.75,-2.7) D86(-15.25,-2.7) D87(-15.75,-2.7) D88(-16.25,-2.7) D89(-16.75,-2.7) D90(-17.25,-2.7) D91(-17.75,-2.7) D92(-18.25,-2.7) D93(-18.75,-2.7) D94(-19.25,-2.7) D95(-19.75,-2.7) D96(-20.25,-2.7) D97(-20.75,-2.7) D98(-21.25,-2.7) D99(-21.75,-2.7) D100(-22.25,-2.7) D101(-22.75,-2.7) D102(-23.25,-2.7) D103(-23.75,-2.7) D104(-24.25,-2.7) D105(-24.75,-2.7) D106(-25.25,-2.7) D107(-25.75,-2.7) D108(-26.25,-2.7) D109(-26.75,-2.7) D110(-27.25,-2.7)
via -28.85,0 diameter 1.6 hole 1.6
via 28.85,0 diameter 0.9 hole 0.9
Top Layer:
  rectangle: 29.75,-1.65 31.4,1.65
  rectangle: -31.4,-1.65 -29.75,1.65
3D body "ept_401-55101-5x_3D.STEP": height 7.45, standoff -0.6, extent -30.9,-3.1 30.9,3.1